# Altium footprint library lib_datalogger.PcbLib: 866 footprints (part 29 of 55)
Each footprint in its own frame and in the unit in brackets; x right, y up, seen from the top. Pads: shape width x height; smd on the part's side, far side on the other; paste and mask are expansions set on the pad; w line width, h text height; cw(c..) or ccw(c..) is an arc to the next point about the centre after c.
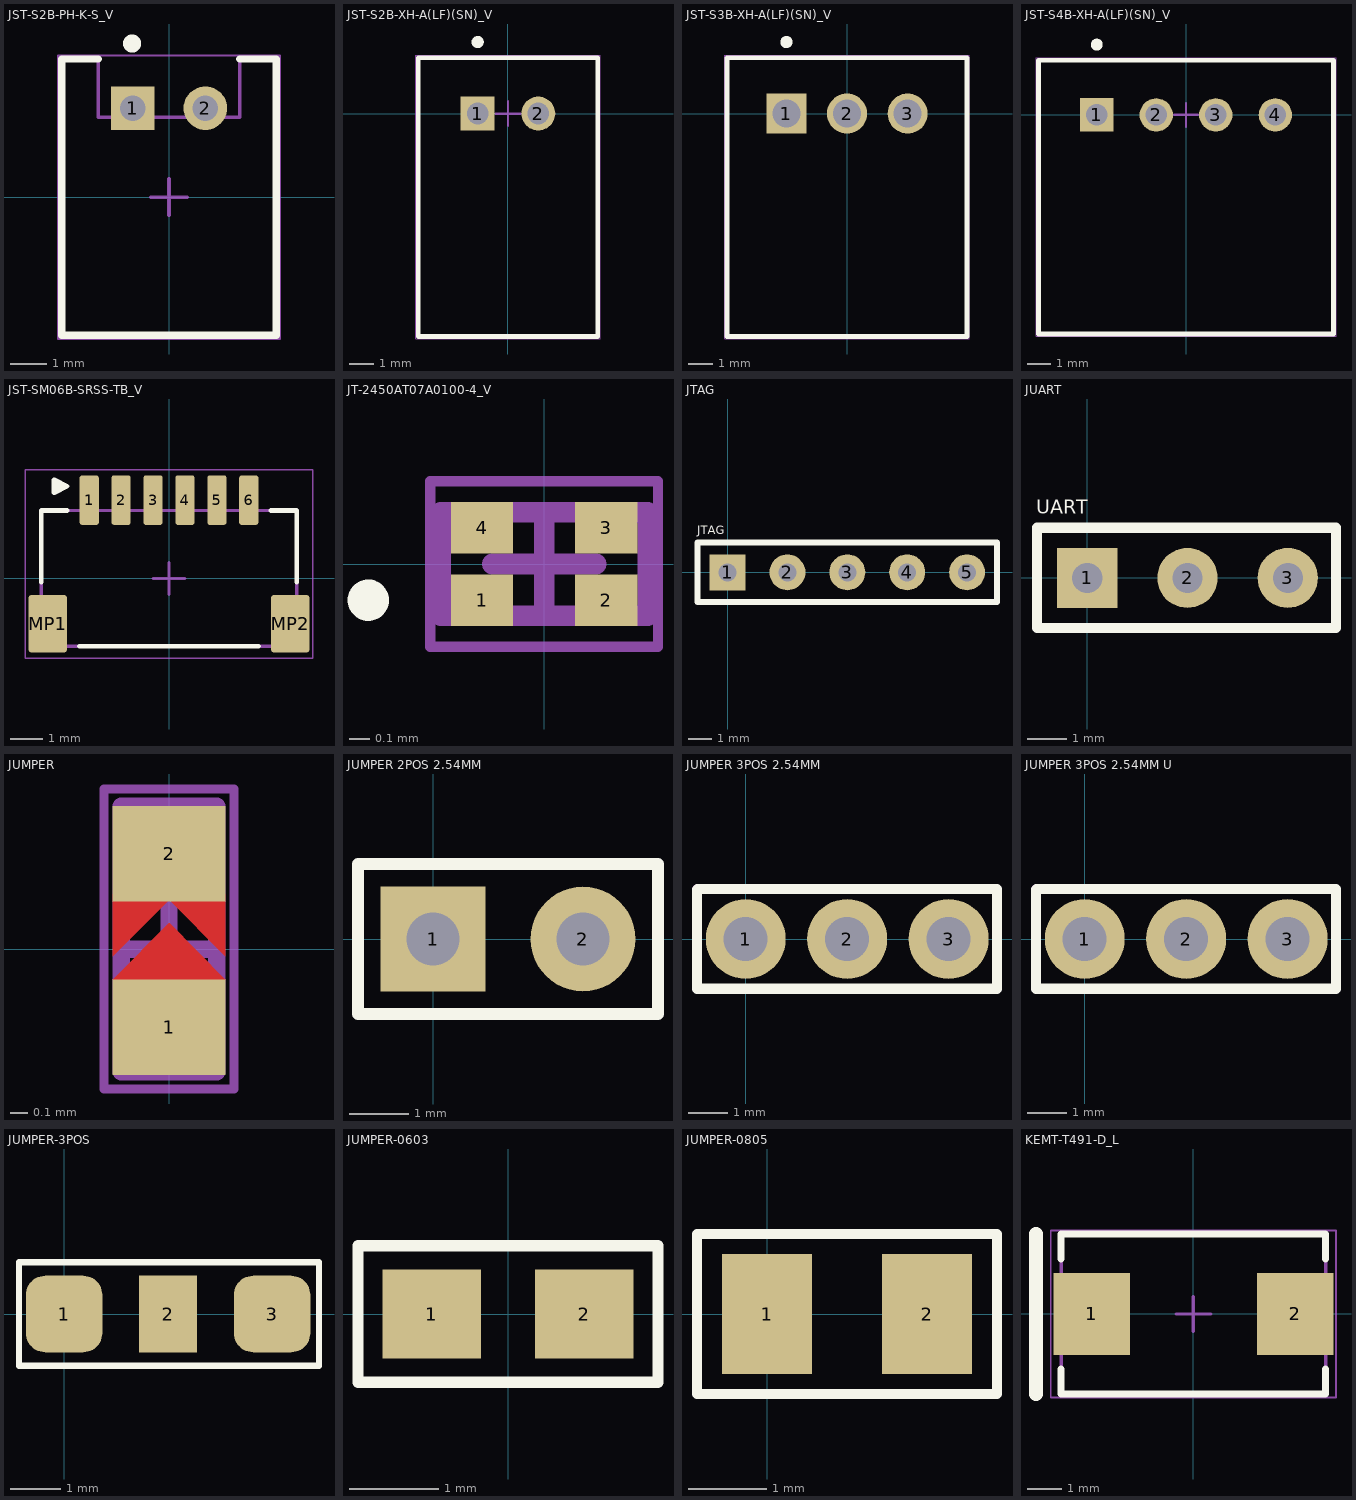
[diagram p28: the footprints below, top view; thin cyan lines are the x and y axes]

## JST-S2B-PH-K-S_V [mm] "THD, 2-Leads, Body 7.6x5.9mm, Pitch 2mm"
height 4.8
pads (2):
  rect 1.2x1.2 hole 0.7: 1(-1,2.45)
  round 1.2 hole 0.7: 2(1,2.45)
Top Overlay:
  circle w0.25: c-1.016,4.228 r0.125
  lines w0.2: -1.95,3.8 -2.95,3.8 -2.95,-3.8 2.95,-3.8 2.95,3.8 1.95,3.8
Mechanical 13:
  lines w0.1: -2.95,-3.8 -2.95,3.8 -1.95,3.8 -1.95,3.8 -1.95,2.2 1.95,2.2 1.95,3.8 2.95,3.8 2.95,-3.8 -2.95,-3.8
Mechanical 15:
  lines w0.05: -3.05,-3.9 3.05,-3.9 3.05,3.9 -3.05,3.9 -3.05,-3.9
  lines w0.1: -0.5,0 0.5,0 ; 0,-0.5 0,0.5
3D body "S2B-PH-K-S.STEP": height 4.8, standoff -3.4, extent -2.95,-3.8 2.95,3.8

## JST-S2B-XH-A(LF)(SN)_V [mm] "Header, 2-Leads, Body 7.4x11.5mm, Pitch 2.5mm"
height 6.1
pads (2):
  rect 1.4x1.4 hole 0.9: 1(-1.25,0)
  round 1.4 hole 0.9: 2(1.25,0)
Top Overlay:
  circle w0.25: c-1.25,2.95 r0.125
  lines w0.2: -3.7,-9.2 3.7,-9.2 3.7,2.3 -3.7,2.3 -3.7,-9.2
Mechanical 13:
  lines w0.1: -3.7,-9.2 3.7,-9.2 3.7,2.3 -3.7,2.3 -3.7,-9.2
Mechanical 15:
  lines w0.05: -3.8,-9.3 3.8,-9.3 3.8,2.4 -3.8,2.4 -3.8,-9.3
  lines w0.1: -0.5,0 0.5,0 ; 0,-0.5 0,0.5
3D body "S2B-XH-A.STEP": height 5.95, standoff -3.4, extent -3.7,-9.2 3.7,2.3

## JST-S3B-XH-A(LF)(SN)_V [mm] "Header, 3-Leads, Body 9.9x11.5mm, Pitch 2.5mm"
height 6.1
pads (3):
  rect 1.65x1.65 hole 1.15: 1(-2.5,0)
  round 1.65 hole 1.15: 2(0,0) 3(2.5,0)
Top Overlay:
  circle w0.25: c-2.5,2.95 r0.125
  lines w0.2: -4.947,2.3 -4.95,2.3 ; -4.95,2.3 4.95,2.3 4.95,-9.2 -4.95,-9.2 -4.95,2.3
Mechanical 13:
  lines w0.1: -4.95,-9.2 -4.95,2.3 4.95,2.3 4.95,-9.2 -4.95,-9.2
Mechanical 15:
  lines w0.05: -5.05,-9.3 -5.05,2.4 5.05,2.4 5.05,-9.3 -5.05,-9.3
  lines w0.1: -0.5,0 0.5,0 ; 0,-0.5 0,0.5
3D body "S3B-XH-A.STEP": height 6.15, standoff -3.4, extent -4.95,-9.2 4.95,2.3

## JST-S4B-XH-A(LF)(SN)_V [mm] "Header, 4-Leads, Body 12.4x11.5mm, Pitch 2.5mm"
height 6.1
pads (4):
  rect 1.4x1.4 hole 0.9: 1(-3.75,0)
  round 1.4 hole 0.9: 2(-1.25,0) 3(1.25,0) 4(3.75,0)
Top Overlay:
  circle w0.25: c-3.75,2.95 r0.125
  lines w0.2: -6.197,2.3 -6.2,2.3 ; -6.2,2.3 -6.2,-9.2 6.2,-9.2 6.2,2.3 -6.2,2.3
Mechanical 13:
  lines w0.1: -6.2,-9.2 6.2,-9.2 6.2,2.3 -6.2,2.3 -6.2,-9.2
Mechanical 15:
  lines w0.05: -6.3,-9.3 6.3,-9.3 6.3,2.4 -6.3,2.4 -6.3,-9.3
  lines w0.1: -0.5,0 0.5,0 ; 0,-0.5 0,0.5
3D body "S4B-XH-A.STEP": height 6.15, standoff -3.4, extent -6.2,-9.2 6.2,2.3

## JST-SM06B-SRSS-TB_V [mm] "SMD, 6-Leads, Body 8x4.25mm, Pitch 1mm"
height 2.95
pads (8):
  rrect25% 0.6x1.55 smd: 1(-2.5,2.45) 2(-1.5,2.45) 3(-0.5,2.45) 4(0.5,2.45) 5(1.5,2.45) 6(2.5,2.45)
  rrect15% 1.2x1.8 smd: MP1(-3.8,-1.425) MP2(3.8,-1.425)
Top Overlay:
  region: -3.6,3.088 -3.6,2.688 -3.2,2.888
  lines w0.15: -4,-0.125 -4,2.125 -3.2,2.125 ; -2.8,-2.125 2.8,-2.125 ; 3.2,2.125 4,2.125 4,-0.125 ; -3.6,2.688 -3.6,3.088 -3.2,2.888 -3.6,2.688
Mechanical 13:
  lines w0.1: -4,-2.125 -4,2.125 4,2.125 4,-2.125 -4,-2.125
Mechanical 15:
  lines w0.05: -4.5,-2.5 -4.5,3.4 4.5,3.4 4.5,-2.5 -4.5,-2.5
  lines w0.1: -0.5,0 0.5,0 ; 0,-0.5 0,0.5
Top Designator:
  text ".Designator" at -1.27,-1.016 h0.6
3D body "SM06B-SRSS-TB.STEP": height 2.9, standoff 0, extent -4,-2.15 4,2.8

## JT-2450AT07A0100-4_V [mm] "DFN, 4-Leads, Body 1x0.5mm, Pitch 0.60mm"
height 0.37
pads (4):
  rect 0.3x0.25 smd: 1(-0.3,-0.175) 2(0.3,-0.175) 3(0.3,0.175) 4(-0.3,0.175)
Top Overlay:
  circle w0.1: c-0.85,-0.175 r0.05
Mechanical 13:
  lines w0.1: -0.5,-0.25 -0.5,0.25 0.5,0.25 0.5,-0.25 -0.5,-0.25
Mechanical 15:
  lines w0.05: -0.55,-0.4 -0.55,0.4 0.55,0.4 0.55,-0.4 -0.55,-0.4
  lines w0.1: -0.25,0 0.25,0 ; 0,-0.25 0,0.25
3D body: height 0.37, standoff 0, extent -0.5,-0.25 0.5,0.25

## JTAG [mil]
pads (5):
  rect 60x60 hole 30: 1(0,0)
  round 60 hole 30: 2(100,0) 3(200,0) 4(300,0) 5(400,0)
Top Overlay:
  lines w10: -50,-50 -50,50 450,50 450,-50 -50,-50
  text "JTAG" at -51.06,63.94 h13.78

## JUART [mil]
pads (3):
  rect 60x60 hole 30: 1(0,0)
  round 60 hole 30: 2(100,0) 3(200,0)
Top Overlay:
  lines w10: -50,-50 -50,50 248.03,50 248.03,-50 -50,-50
  text "UART" at -51.06,63.94 h13.78

## JUMPER [mm]
pads (2):
  rect 0.65x0.55 smd paste-2.54 mask-2.54: 1(0,-0.45) 2(0,0.55)
Top Layer:
  region: -0.325,-0.041 0,0.284 0.325,-0.041 0.325,0.318 -0.325,0.318
  region: -0.325,-0.175 0.003,0.152 0.325,-0.175
Top Solder:
  rectangle: -0.325,-0.728 0.325,0.822
Mechanical 13:
  lines w0.1: -0.275,-0.706 0.275,-0.706 0.275,0.823 -0.275,0.823 -0.275,-0.706
Mechanical 15:
  lines w0.05: -0.375,-0.806 0.375,-0.806 0.375,0.923 -0.375,0.923 -0.375,-0.806
  lines w0.1: -0.25,0 0.25,0 ; 0,-0.25 0,0.25

## JUMPER 2POS 2.54MM [mil] "Connector; Header; 2 Position"
height 78.74
pads (2):
  rect 70x70 hole 35.43: 1(0,0)
  round 70 hole 35.43: 2(100,0)
Top Overlay:
  lines w7.87: -50,-50 150,-50 150,50 -50,50 -50,-50
3D body "SW3dPS-Jumper SL2.STEP": height 374.02, standoff -102.36, extent -48.43,-50 148.43,50

## JUMPER 3POS 2.54MM [mm] "Chip Resistor; Body 1.6 x 0.8 mm (LxW typ)"
height 1.35
pads (3):
  round 2 hole 1.1: 1(0,0) 2(2.54,0) 3(5.08,0)
Top Overlay:
  lines w0.254: -1.219,1.241 -1.219,-1.245 6.285,-1.245 6.29,-1.25 6.29,1.25 -1.21,1.25
Mechanical 1:
  lines w0.254: -1.219,1.241 -1.21,1.25
3D body "JUMPER3.step": height 16.31, standoff -2.5, extent -1.21,-1.25 6.29,1.25

## JUMPER 3POS 2.54MM U [mm] "Chip Resistor; Body 1.6 x 0.8 mm (LxW typ)"
height 1.35
pads (3):
  round 2 hole 1.1: 1(0,0) 2(2.54,0) 3(5.08,0)
Top Overlay:
  lines w0.254: -1.219,1.241 -1.219,-1.245 6.285,-1.245 6.29,-1.25 6.29,1.25 -1.21,1.25
Mechanical 1:
  lines w0.254: -1.219,1.241 -1.21,1.25
3D body "CircuitWorks-JUMPER.STEP": height 9.25, standoff 2.75, extent -1.27,-1.175 3.73,1.175
3D body "2.54mm Pin Header THT Straight 3p.stp": height 8.77, standoff -2.77, extent -1.27,-1.27 6.35,1.27

## JUMPER-3POS [mm] "Chip Capacitor"
pads (3):
  rrect50% 1.51x1.51 smd: 1(0,0) 3(4.1,0)
  rect 1.143x1.524 smd: 2(2.05,0)
Top Overlay:
  lines w0.127: -0.889,-1.016 -0.889,1.016 5.025,1.016 5.025,-1.016 -0.889,-1.016

## JUMPER-0603 [mm] "Chip Resistor; Body 1.6 x 0.8 mm (LxW typ)"
height 1.35
pads (2):
  rect 1.1x1 smd: 1(-0.85,0) 2(0.85,0)
Top Overlay:
  lines w0.127: -1.676,-0.762 -1.676,0.762 1.676,0.762 1.676,-0.762 -1.676,-0.762

## JUMPER-0805 [mil] "Chip Capacitor"
pads (2):
  rect 45x60 smd: 1(0,0) 2(80,0)
Top Overlay:
  lines w5: -35,-40 115,-40 115,40 -35,40 -35,-40

## KEMT-T491-D_L [mm] "Molded Capacitor, 2-Leads, Body 7.60x4.60mm, IPC High Density"
height 3.1
pads (2):
  rect 2.2x2.35 smd: 1(-2.925,0) 2(2.925,0)
Top Overlay:
  lines w0.2: -3.8,-1.575 -3.8,-2.3 3.8,-2.3 3.8,-1.575 ; -3.8,1.575 -3.8,2.3 3.8,2.3 3.8,1.575
  lines w0.4: -4.525,-2.3 -4.525,2.3
Mechanical 13:
  lines w0.1: -3.8,-2.3 -3.8,2.3 3.8,2.3 3.8,-2.3 -3.8,-2.3
Mechanical 15:
  lines w0.05: -4.1,-2.4 -4.1,2.4 4.1,2.4 4.1,-2.4 -4.1,-2.4
  lines w0.1: -0.5,0 0.5,0 ; 0,-0.5 0,0.5
3D body "T491D476M006AT.step": height 3.1, standoff 0, extent -3.8,-2.3 3.8,2.3